# Altium footprint library SomoPowerPackControl.PcbLib: 145 footprints (part 4 of 10)
Each footprint in its own frame and in the unit in brackets; x right, y up, seen from the top. Pads: shape width x height; smd on the part's side, far side on the other; paste and mask are expansions set on the pad; w line width, h text height; cw(c..) or ccw(c..) is an arc to the next point about the centre after c.
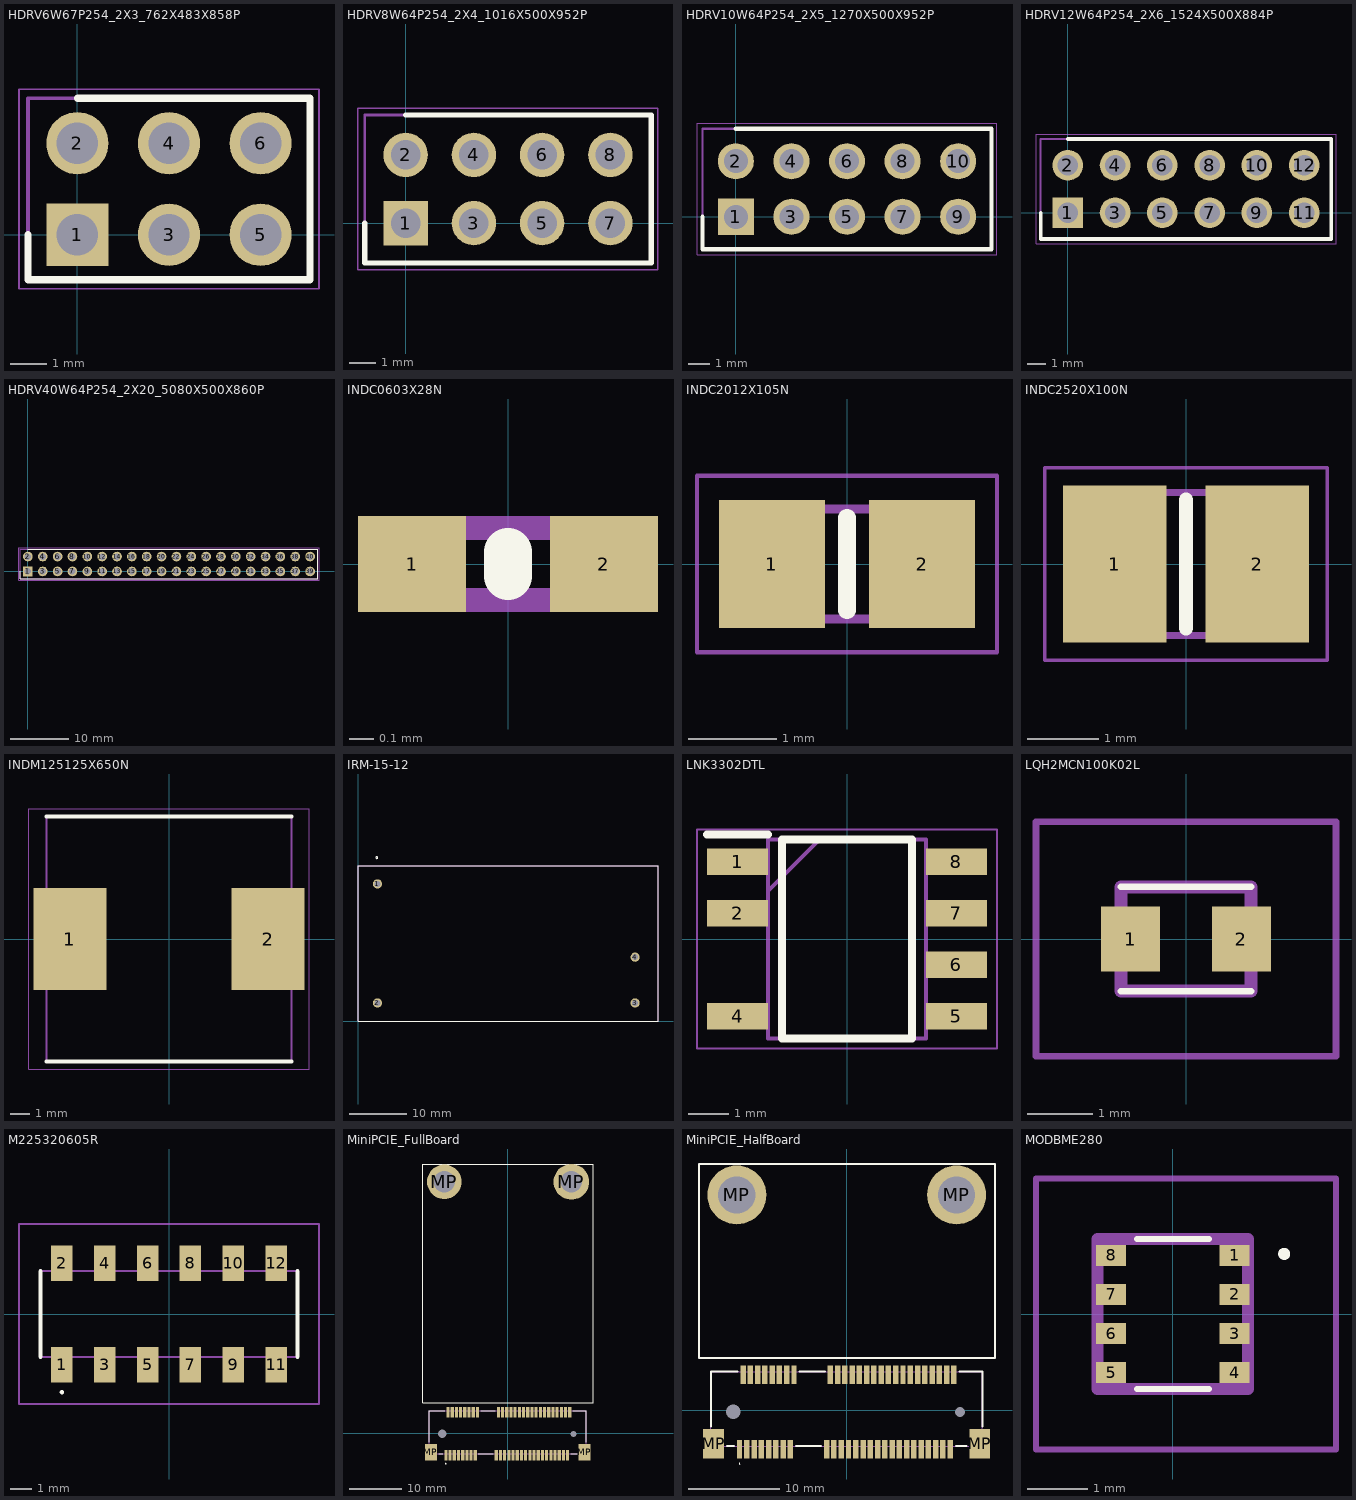
[diagram p3: the footprints below, top view; thin cyan lines are the x and y axes]

## HDRV6W67P254_2X3_762X483X858P [mm]
pads (6):
  rect 1.725x1.725 hole 1.15: 1(0,0)
  round 1.725 hole 1.15: 2(0,2.54) 3(2.54,0) 4(2.54,2.54) 5(5.08,0) 6(5.08,2.54)
Top Overlay:
  lines w0.2: -1.37,0 -1.37,-1.245 6.45,-1.245 6.45,3.785 0,3.785
Mechanical 13:
  lines w0.1: -1.37,-1.245 6.45,-1.245 6.45,3.785 -1.37,3.785 -1.37,-1.245
Mechanical 15:
  lines w0.05: -1.62,-1.495 6.7,-1.495 6.7,4.035 -1.62,4.035 -1.62,-1.495
3D body "10129381-906002BLF.stp": height 8.27, standoff -2.4, extent -1.27,-1.145 6.35,3.685

## HDRV8W64P254_2X4_1016X500X952P [mm]
pads (8):
  rect 1.65x1.65 hole 1.1: 1(0,0)
  round 1.65 hole 1.1: 2(0,2.54) 3(2.54,0) 4(2.54,2.54) 5(5.08,0) 6(5.08,2.54) 7(7.62,0) 8(7.62,2.54)
Top Overlay:
  lines w0.2: -1.524,0 -1.524,-1.484 9.144,-1.484 9.144,4.024 0,4.024
Mechanical 13:
  lines w0.1: -1.524,-1.484 9.144,-1.484 9.144,4.024 -1.524,4.024 -1.524,-1.484
Mechanical 15:
  lines w0.05: -1.774,-1.734 9.394,-1.734 9.394,4.274 -1.774,4.274 -1.774,-1.734
3D body "PH2-08-UA.stp": height 9.52, standoff -3.56, extent -1.27,-1.23 8.89,3.77

## HDRV10W64P254_2X5_1270X500X952P [mm]
pads (10):
  rect 1.65x1.65 hole 1.1: 1(0,0)
  round 1.65 hole 1.1: 2(0,2.54) 3(2.54,0) 4(2.54,2.54) 5(5.08,0) 6(5.08,2.54) 7(7.62,0) 8(7.62,2.54) 9(10.16,0) 10(10.16,2.54)
Top Overlay:
  lines w0.2: -1.524,0 -1.524,-1.484 11.684,-1.484 11.684,4.024 0,4.024
Mechanical 13:
  lines w0.1: -1.524,-1.484 11.684,-1.484 11.684,4.024 -1.524,4.024 -1.524,-1.484
Mechanical 15:
  lines w0.05: -1.774,-1.734 11.934,-1.734 11.934,4.274 -1.774,4.274 -1.774,-1.734
3D body "PH2-10-UA.stp": height 9.52, standoff -3.56, extent -1.27,-1.23 11.43,3.77

## HDRV12W64P254_2X6_1524X500X884P [mm]
pads (12):
  rect 1.65x1.65 hole 1.1: 1(0,0)
  round 1.65 hole 1.1: 2(0,2.54) 3(2.54,0) 4(2.54,2.54) 5(5.08,0) 6(5.08,2.54) 7(7.62,0) 8(7.62,2.54) 9(10.16,0) 10(10.16,2.54) 11(12.7,0) 12(12.7,2.54)
Top Overlay:
  lines w0.2: -1.46,0 -1.46,-1.422 14.161,-1.422 14.161,3.963 0,3.963
Mechanical 13:
  lines w0.1: -1.46,-1.422 14.161,-1.422 14.161,3.963 -1.46,3.963 -1.46,-1.422
Mechanical 15:
  lines w0.05: -1.71,-1.672 14.411,-1.672 14.411,4.213 -1.71,4.213 -1.71,-1.672
3D body "PH2-12-UA.stp": height 8.84, standoff -3.43, extent -1.27,-1.232 13.97,3.772

## HDRV40W64P254_2X20_5080X500X860P [mm]
pads (40):
  rect 1.65x1.65 hole 1.1: 1(0,0)
  round 1.65 hole 1.1: 2(0,2.54) 3(2.54,0) 4(2.54,2.54) 5(5.08,0) 6(5.08,2.54) 7(7.62,0) 8(7.62,2.54) 9(10.16,0) 10(10.16,2.54) 11(12.7,0) 12(12.7,2.54) 13(15.24,0) 14(15.24,2.54) 15(17.78,0) 16(17.78,2.54) 17(20.32,0) 18(20.32,2.54) 19(22.86,0) 20(22.86,2.54) 21(25.4,0) 22(25.4,2.54) 23(27.94,0) 24(27.94,2.54) 25(30.48,0) 26(30.48,2.54) 27(33.02,0) 28(33.02,2.54) 29(35.56,0) 30(35.56,2.54) 31(38.1,0) 32(38.1,2.54) 33(40.64,0) 34(40.64,2.54) 35(43.18,0) 36(43.18,2.54) 37(45.72,0) 38(45.72,2.54) 39(48.26,0) 40(48.26,2.54)
Top Overlay:
  lines w0.2: -1.27,0 -1.27,-1.23 49.53,-1.23 49.53,3.77 0,3.77
Mechanical 13:
  lines w0.1: -1.27,-1.23 49.53,-1.23 49.53,3.77 -1.27,3.77 -1.27,-1.23
Mechanical 15:
  lines w0.05: -1.52,-1.48 49.78,-1.48 49.78,4.02 -1.52,4.02 -1.52,-1.48
3D body "PR20204VBDN.stp": height 8.6, standoff -3, extent -1.27,-1.23 49.53,3.77

## INDC0603X28N [mm]
pads (2):
  rect 0.45x0.4 smd: 1(-0.4,0) 2(0.4,0)
Top Overlay:
  lines w0.2: 0,-0.05 0,0.05
Mechanical 13:
  lines w0.1: -0.3,-0.15 0.3,-0.15 0.3,0.15 -0.3,0.15 -0.3,-0.15
3D body "ATFC-0201HQ-2N0B-T.stp": height 0.28, standoff 0, extent -0.3,-0.15 0.3,0.15

## INDC2012X105N [mm]
pads (2):
  rect 1.2x1.45 smd: 1(-0.85,0) 2(0.85,0)
Top Overlay:
  lines w0.2: 0,-0.525 0,0.525
Mechanical 13:
  lines w0.1: -1,-0.625 -1,0.625 1,0.625 1,-0.625 -1,-0.625
Mechanical 15:
  lines w0.05: -1.7,-1 -1.7,1 1.7,1 1.7,-1 -1.7,-1
3D body "MLZ2012N100LT000.stp": height 1.05, standoff 0, extent -1,-0.625 1,0.625

## INDC2520X100N [mm]
pads (2):
  rect 1.45x2.2 smd: 1(-1,0) 2(1,0)
Top Overlay:
  lines w0.2: 0,-0.9 0,0.9
Mechanical 13:
  lines w0.1: -1.25,-1 -1.25,1 1.25,1 1.25,-1 -1.25,-1
Mechanical 15:
  lines w0.05: -1.975,-1.35 -1.975,1.35 1.975,1.35 1.975,-1.35 -1.975,-1.35
3D body "AOTA-B252010S100MT.stp": height 1, standoff 0, extent -1.25,-1 1.25,1

## INDM125125X650N [mm]
pads (2):
  rect 3.7x5.2 smd: 1(-5.05,0) 2(5.05,0)
Top Overlay:
  lines w0.2: -6.25,-6.25 6.25,-6.25 ; -6.25,6.25 6.25,6.25
Mechanical 13:
  lines w0.1: -6.25,-6.25 -6.25,6.25 6.25,6.25 6.25,-6.25 -6.25,-6.25
Mechanical 15:
  lines w0.05: -7.15,-6.65 -7.15,6.65 7.15,6.65 7.15,-6.65 -7.15,-6.65
3D body "SRR1260-102K.stp": height 6.5, standoff 0, extent -6.25,-6.25 6.25,6.25

## IRM-15-12 [mm]
pads (4):
  round 1.6 hole 1.04: 1(3.4,24) 2(3.4,3.2) 3(48.4,3.2) 4(48.4,11.2)
Top Overlay:
  circle w0.2: c3.28,28.59 r0.161
  lines w0.2: 0,0 52.4,0 52.4,27.2 0,27.2 0,0
Mechanical 13:
  lines w0.2: 0,0 0,27.2 52.4,27.2 52.4,0 0,0
3D body "IRM-15-12.stp": height 25.35, standoff -2.36, extent 0.431,0.603 52.831,27.803

## LNK3302DTL [mm]
pads (7):
  rect 1.5x0.65 smd: 1(-2.7,1.905) 2(-2.7,0.635) 4(-2.7,-1.905) 5(2.7,-1.905) 6(2.7,-0.635) 7(2.7,0.635) 8(2.7,1.905)
Top Overlay:
  lines w0.2: -3.45,2.58 -1.95,2.58 ; -1.6,-2.45 -1.6,2.45 1.6,2.45 1.6,-2.45 -1.6,-2.45
Mechanical 13:
  lines w0.1: -1.95,1.18 -0.68,2.45 ; -1.95,-2.45 -1.95,2.45 1.95,2.45 1.95,-2.45 -1.95,-2.45
Mechanical 15:
  lines w0.05: -3.7,-2.7 -3.7,2.7 3.7,2.7 3.7,-2.7 -3.7,-2.7

## LQH2MCN100K02L [mm]
pads (2):
  rect 0.9x1 smd: 1(-0.85,0) 2(0.85,0)
Top Overlay:
  lines w0.1: -1,-0.8 1,-0.8 ; -1,0.8 1,0.8
Mechanical 13:
  lines w0.2: -1,-0.8 -1,0.8 1,0.8 1,-0.8 -1,-0.8
Mechanical 15:
  lines w0.1: -2.3,-1.8 -2.3,1.8 2.3,1.8 2.3,-1.8 -2.3,-1.8
3D body "LQH2MPZ680MGRL.stp": height 0.97, standoff 0, extent -1,-0.8 1,0.8

## M225320605R [mm]
pads (12):
  rect 1x1.65 smd: 1(-5,-2.375) 2(-5,2.375) 3(-3,-2.375) 4(-3,2.375) 5(-1,-2.375) 6(-1,2.375) 7(1,-2.375) 8(1,2.375) 9(3,-2.375) 10(3,2.375) 11(5,-2.375) 12(5,2.375)
Top Overlay:
  lines w0.1: -5,-3.7 cw(c-5,-3.65) -5,-3.6 cw(c-5,-3.65) -5,-3.7
  lines w0.2: -6,-2 -6,2 ; 6,-2 6,2
Mechanical 13:
  lines w0.1: -6,-2 6,-2 6,2 -6,2 -6,-2
Mechanical 15:
  lines w0.1: -7,-4.2 7,-4.2 7,4.2 -7,4.2 -7,-4.2
3D body "BF030-12A-B0-0600-0277-0600-LB.stp": height 8.77, standoff 0, extent -6.13,-3 6.07,3

## MiniPCIE_FullBoard [mm]
pads (58):
  rect 0.6x2 smd: 1(-11.8,-4.27) 2(-11.4,3.93) 3(-11,-4.27) 4(-10.6,3.93) 5(-10.2,-4.27) 6(-9.8,3.93) 7(-9.4,-4.27) 8(-9,3.93) 9(-8.6,-4.27) 10(-8.2,3.93) 11(-7.8,-4.27) 12(-7.4,3.93) 13(-7,-4.27) 14(-6.6,3.93) 15(-6.2,-4.27) 16(-5.8,3.93) 17(-2.2,-4.27) 18(-1.8,3.93) 19(-1.4,-4.27) 20(-1,3.93) 21(-0.6,-4.27) 22(-0.2,3.93) 23(0.2,-4.27) 24(0.6,3.93) 25(1,-4.27) 26(1.4,3.93) 27(1.8,-4.27) 28(2.2,3.93) 29(2.6,-4.27) 30(3,3.93) 31(3.4,-4.27) 32(3.8,3.93) 33(4.2,-4.27) 34(4.6,3.93) 35(5,-4.27) 36(5.4,3.93) 37(5.8,-4.27) 38(6.2,3.93) 39(6.6,-4.27) 40(7,3.93) 41(7.4,-4.27) 42(7.8,3.93) 43(8.2,-4.27) 44(8.6,3.93) 45(9,-4.27) 46(9.4,3.93) 47(9.8,-4.27) 48(10.2,3.93) 49(10.6,-4.27) 50(11,3.93) 51(11.4,-4.27) 52(11.8,3.93)
  round 0.8 hole 1.6 unplated: 55(-12.5,-0.17)
  round 0.55 hole 1.1 unplated: 56(12.5,-0.17)
  rect 2.3x3.2 smd: MP(-14.65,-3.67) MP(14.65,-3.67)
  round 6.6 hole 4.1: MP(-12.1,47.88)
  round 6.8 hole 4.1: MP(12.1,47.88)
Top Overlay:
  lines w0.1: -11.8,-5.9 ccw(c-11.8,-5.85) -11.8,-5.8 ccw(c-11.8,-5.85) -11.8,-5.9
  lines w0.2: -16.26,5.78 -16.26,51.28 16.3,51.28 ; -16.23,5.78 16.33,5.78 ; -14.95,-1.8 -14.95,4.27 -12,4.27 ; -13.2,-3.93 -12.4,-3.93 ; -5.6,-3.93 -2.8,-3.93 ; -5.2,4.27 -2.4,4.27 ; 12,-3.93 13.2,-3.93 ; 12.4,4.27 14.95,4.27 14.95,-1.8 ; 16.33,5.778 16.33,51.278
Mechanical 13:
  lines w0.1: -14.95,-3.93 -14.95,4.27 14.95,4.27 14.95,-3.93 -14.95,-3.93
3D body "1775838-2.stp": height 5.68, standoff -0.58, extent -14.95,-4.54 14.95,4.54

## MiniPCIE_HalfBoard [mm]
pads (58):
  rect 0.6x2 smd: 1(-11.8,-4.27) 2(-11.4,3.93) 3(-11,-4.27) 4(-10.6,3.93) 5(-10.2,-4.27) 6(-9.8,3.93) 7(-9.4,-4.27) 8(-9,3.93) 9(-8.6,-4.27) 10(-8.2,3.93) 11(-7.8,-4.27) 12(-7.4,3.93) 13(-7,-4.27) 14(-6.6,3.93) 15(-6.2,-4.27) 16(-5.8,3.93) 17(-2.2,-4.27) 18(-1.8,3.93) 19(-1.4,-4.27) 20(-1,3.93) 21(-0.6,-4.27) 22(-0.2,3.93) 23(0.2,-4.27) 24(0.6,3.93) 25(1,-4.27) 26(1.4,3.93) 27(1.8,-4.27) 28(2.2,3.93) 29(2.6,-4.27) 30(3,3.93) 31(3.4,-4.27) 32(3.8,3.93) 33(4.2,-4.27) 34(4.6,3.93) 35(5,-4.27) 36(5.4,3.93) 37(5.8,-4.27) 38(6.2,3.93) 39(6.6,-4.27) 40(7,3.93) 41(7.4,-4.27) 42(7.8,3.93) 43(8.2,-4.27) 44(8.6,3.93) 45(9,-4.27) 46(9.4,3.93) 47(9.8,-4.27) 48(10.2,3.93) 49(10.6,-4.27) 50(11,3.93) 51(11.4,-4.27) 52(11.8,3.93)
  round 0.8 hole 1.6 unplated: 55(-12.5,-0.17)
  round 0.55 hole 1.1 unplated: 56(12.5,-0.17)
  rect 2.3x3.2 smd: MP(-14.65,-3.67) MP(14.65,-3.67)
  round 6.5 / inner round 6.5 / far side round 0 hole 4.1: MP(-12.1,23.73) MP(12.1,23.73)
Top Overlay:
  lines w0.1: -11.8,-5.9 ccw(c-11.8,-5.85) -11.8,-5.8 ccw(c-11.8,-5.85) -11.8,-5.9
  lines w0.2: -16.26,5.78 -16.26,27.13 16.3,27.13 ; -16.23,5.78 16.33,5.78 ; -14.95,-1.8 -14.95,4.27 -12,4.27 ; -13.2,-3.93 -12.4,-3.93 ; -5.6,-3.93 -2.8,-3.93 ; -5.2,4.27 -2.4,4.27 ; 12,-3.93 13.2,-3.93 ; 12.4,4.27 14.95,4.27 14.95,-1.8 ; 16.33,5.778 16.33,27.13
Mechanical 13:
  lines w0.1: -14.95,-3.93 -14.95,4.27 14.95,4.27 14.95,-3.93 -14.95,-3.93
3D body "Bushing_M2.5x2.STEP": height 2.5, standoff -1, extent 8.6,20.242 15.6,27.218
3D body "Bushing_M2.5x2.STEP": height 2.5, standoff -1, extent -15.6,20.242 -8.6,27.218
3D body "1775838-2.stp": height 5.68, standoff -0.58, extent -14.95,-4.54 14.95,4.54

## MODBME280 [mm]
pads (8):
  rect 0.5x0.35 smd: 1(1.025,0.975) 2(1.025,0.325) 3(1.025,-0.325) 4(1.025,-0.975) 5(-1.025,-0.975) 6(-1.025,-0.325) 7(-1.025,0.325) 8(-1.025,0.975)
Top Overlay:
  lines w0.1: -0.6,-1.25 0.6,-1.25 ; -0.6,1.25 0.6,1.25 ; 1.8,1 ccw(c1.85,1) 1.9,1 ccw(c1.85,1) 1.8,1
Mechanical 13:
  lines w0.2: -1.25,-1.25 1.25,-1.25 1.25,1.25 -1.25,1.25 -1.25,-1.25
Mechanical 15:
  lines w0.1: -2.275,-2.25 2.712,-2.25 ; -2.275,-2.25 -2.275,2.25 ; -2.275,-2.25 2.712,-2.25 ; -2.275,-2.25 -2.275,2.25 ; -2.275,2.25 2.712,2.25 ; -2.275,2.25 2.712,2.25 ; 2.712,-2.25 2.712,2.25 ; 2.712,-2.25 2.712,2.25
3D body "MOD-BME280.stp": height 0.93, standoff 0, extent -1.25,-1.25 1.25,1.25